# Altium footprint library PcbLib1.PcbLib: 62 footprints (part 4 of 4)
Each footprint in its own frame and in the unit in brackets; x right, y up, seen from the top. Pads: shape width x height; smd on the part's side, far side on the other; paste and mask are expansions set on the pad; w line width, h text height; cw(c..) or ccw(c..) is an arc to the next point about the centre after c.
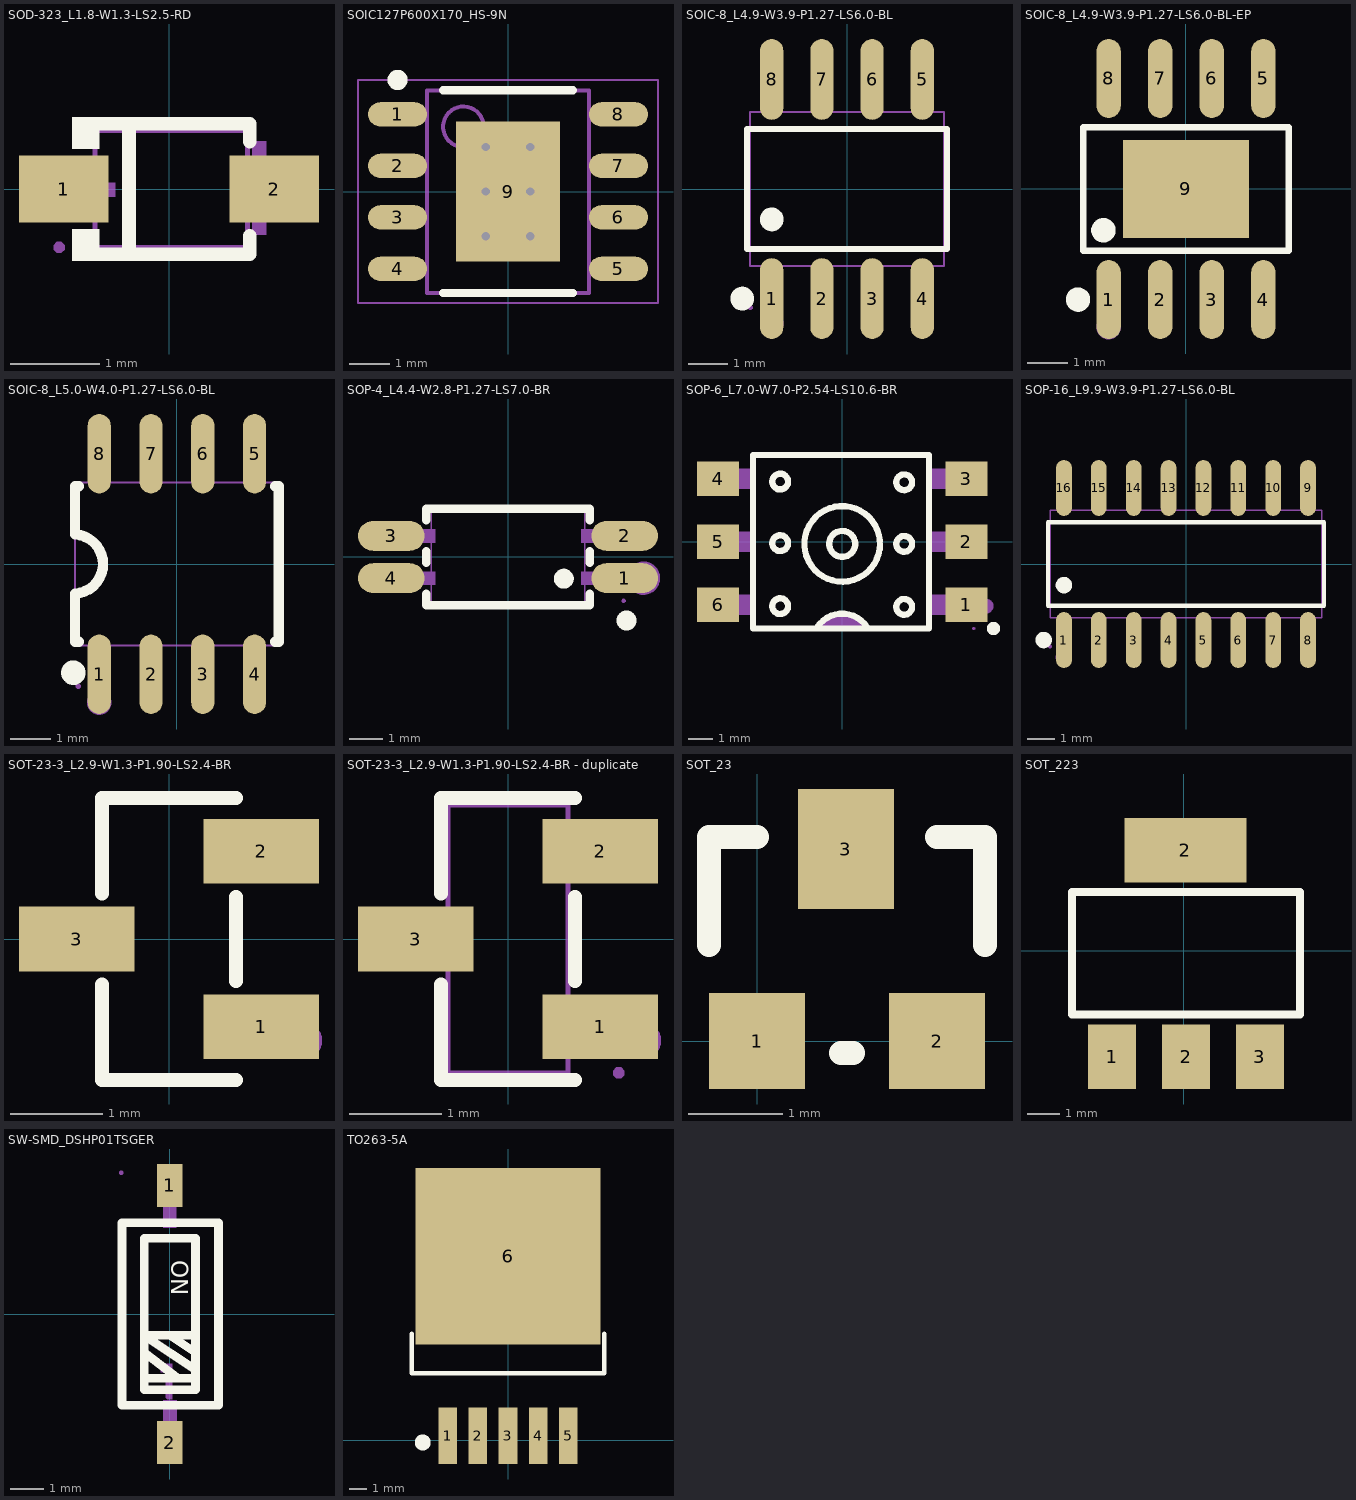
[diagram p3: the footprints below, top view; thin cyan lines are the x and y axes]

## SOD-323_L1.8-W1.3-LS2.5-RD [mm] "tvs"
pads (2):
  rect 1x0.75 smd: 1(-1.173,0) 2(1.173,0)
Top Overlay:
  region: -0.775,0.802 -0.775,0.45 -1.08,0.45 -1.08,0.802
  region: -0.775,-0.802 -0.775,-0.45 -1.08,-0.45 -1.08,-0.802
  lines w0.152: -0.851,-0.726 0.901,-0.726 0.901,-0.52 ; -0.851,0.726 0.901,0.726 0.901,0.53 ; -0.447,-0.726 -0.447,0.726
Mechanical 6:
  region: -1.225,0.07 -1.225,-0.086 -0.601,-0.086 -0.601,0.07
  region: 1.315,0.09 1.315,-0.066 0.691,-0.066 0.691,0.09
  region: 1.083,0.53 1.083,-0.51 0.927,-0.51 0.927,0.53
Mechanical 15:
  region: -1.165,-0.65 -1.165,-0.625 -1.2,-0.59 -1.25,-0.59 -1.285,-0.625 -1.285,-0.65 -1.285,-0.675 -1.25,-0.71 -1.2,-0.71 -1.165,-0.675
  region: 1.275,0.16 1.275,-0.16 0.975,-0.16 0.975,0.16
  region: 0.985,0.16 0.985,-0.16 0.865,-0.16 0.865,0.16
  region: -0.925,0.16 -0.925,-0.16 -1.225,-0.16 -1.225,0.16
  region: -0.815,0.16 -0.815,-0.16 -0.935,-0.16 -0.935,0.16
  lines w0.051: -0.825,-0.65 0.875,-0.65 0.875,0.65 -0.825,0.65 -0.825,-0.65

## SOIC127P600X170_HS-9N [mm] "SOIC, 8-Leads, Body 4.90x3.90mm, Pitch 1.27mm, Thermal Pad 3.45x2.56mm, IPC Medium Density转压"
height 1.7
pads (9):
  oval 1.45x0.6 smd: 1(-2.725,1.905) 2(-2.725,0.635) 3(-2.725,-0.635) 4(-2.725,-1.905) 5(2.725,-1.905) 6(2.725,-0.635) 7(2.725,0.635) 8(2.725,1.905)
  rect 2.56x3.45 smd: 9(0,0)
via -0.55,1.1 diameter 0.5 hole 0.2
via 0.55,1.1 diameter 0.5 hole 0.2
via -0.55,0 diameter 0.5 hole 0.2
via 0.55,0 diameter 0.5 hole 0.2
via -0.55,-1.1 diameter 0.5 hole 0.2
via 0.55,-1.1 diameter 0.5 hole 0.2
Top Overlay:
  circle w0.25: c-2.725,2.755 r0.125
  lines w0.2: -1.6,-2.5 1.6,-2.5 ; -1.6,2.5 1.6,2.5
Mechanical 13:
  circle w0.1: c-1.1,1.6 r0.5
  lines w0.1: -2,-2.5 -2,2.5 2,2.5 2,-2.5 -2,-2.5
Mechanical 15:
  lines w0.05: -3.7,-2.75 -3.7,2.75 3.7,2.75 3.7,-2.75 -3.7,-2.75
  lines w0.1: -0.5,0 0.5,0 ; 0,-0.5 0,0.5
3D body "SOIC127P600X170_HS-9N.step": height 1.7, standoff 0, extent -3,-2.5 3,2.5

## SOIC-8_L4.9-W3.9-P1.27-LS6.0-BL [mm] "can芯片vp230"
pads (8):
  oval 0.588x2.045 smd: 1(-1.905,-2.772) 2(-0.635,-2.772) 3(0.635,-2.772) 4(1.905,-2.772) 5(1.905,2.772) 6(0.635,2.772) 7(-0.635,2.772) 8(-1.905,2.772)
Top Overlay:
  circle w0.3: c-2.652,-2.772 r0.15
  circle w0.3: c-1.905,-0.769 r0.15
  lines w0.152: -2.526,-1.521 2.526,-1.521 2.526,1.521 -2.526,1.521 -2.526,-1.521
Mechanical 6:
  circle w0.3: c-1.905,-3.4 r0.15
Mechanical 15:
  region: 1.695,2.175 1.695,1.94 2.115,1.94 2.115,2.175
  region: 1.695,3 1.695,2.165 2.115,2.165 2.115,3
  region: 0.425,2.175 0.425,1.94 0.845,1.94 0.845,2.175
  region: 0.425,3 0.425,2.165 0.845,2.165 0.845,3
  region: -0.845,2.175 -0.845,1.94 -0.425,1.94 -0.425,2.175
  region: -0.845,3 -0.845,2.165 -0.425,2.165 -0.425,3
  region: -2.115,2.175 -2.115,1.94 -1.695,1.94 -1.695,2.175
  region: -2.115,3 -2.115,2.165 -1.695,2.165 -1.695,3
  region: 1.695,-2.175 1.695,-1.94 2.115,-1.94 2.115,-2.175
  region: 1.695,-3 1.695,-2.165 2.115,-2.165 2.115,-3
  region: 0.425,-2.175 0.425,-1.94 0.845,-1.94 0.845,-2.175
  region: 0.425,-3 0.425,-2.165 0.845,-2.165 0.845,-3
  region: -0.845,-2.175 -0.845,-1.94 -0.425,-1.94 -0.425,-2.175
  region: -0.845,-3 -0.845,-2.165 -0.425,-2.165 -0.425,-3
  region: -2.115,-2.175 -2.115,-1.94 -1.695,-1.94 -1.695,-2.175
  region: -2.115,-3 -2.115,-2.165 -1.695,-2.165 -1.695,-3
  region: -2.39,-3 -2.39,-2.975 -2.425,-2.94 -2.475,-2.94 -2.51,-2.975 -2.51,-3 -2.51,-3.025 -2.475,-3.06 -2.425,-3.06 -2.39,-3.025
  lines w0.051: -2.45,-1.95 2.45,-1.95 2.45,1.95 -2.45,1.95 -2.45,-1.95
3D body "SOIC-8.STEP": height 1.8, standoff 0.05, extent -2.45,-3.053 2.45,3.053

## SOIC-8_L4.9-W3.9-P1.27-LS6.0-BL-EP [mm]
pads (9):
  oval 0.602x1.941 smd: 1(-1.905,-2.72) 2(-0.635,-2.72) 3(0.635,-2.72) 4(1.905,-2.72) 5(1.905,2.72) 6(0.635,2.72) 7(-0.635,2.72) 8(-1.905,2.72)
  rect 3.098x2.41 smd: 9(0,0)
Top Overlay:
  circle w0.3: c-2.658,-2.721 r0.15
  circle w0.3: c-2.032,-1.016 r0.15
  lines w0.152: -2.526,-1.521 2.526,-1.521 2.526,1.521 -2.526,1.521 -2.526,-1.521
Mechanical 15:
  circle w0.3: c-1.905,-3.4 r0.15

## SOIC-8_L5.0-W4.0-P1.27-LS6.0-BL [mil] "can芯片"
pads (8):
  oval 22.38x76.78 smd: 1(-75,-106.5) 2(-25,-106.5) 3(25,-106.5) 4(75,-106.5) 5(75,106.5) 6(25,106.5) 7(-25,106.5) 8(-75,106.5)
Top Overlay:
  circle w11.81: c-100,-105 r5.91
  lines w10: -98.43,-28.61 ccw(c-99.99,0) -98.23,28.59 ; -98.42,-28.61 -98.42,-59.05 -98.42,-75 -94.83,-75 ; -98.42,28.59 -98.42,59.05 -98.42,75 -94.83,75 ; 94.83,-75 98.42,-75 98.42,-59.05 98.42,59.05 98.42,75 94.83,75
Mechanical 6:
  circle w11.81: c-75,-133.86 r5.91
Mechanical 15:
  region: -92.92,-118.11 -92.92,-117.13 -94.3,-115.75 -96.26,-115.75 -97.64,-117.13 -97.64,-118.11 -97.64,-119.09 -96.26,-120.47 -94.3,-120.47 -92.92,-119.09
  region: 66.93,76.38 66.93,85.63 83.07,85.63 83.07,76.38
  region: 66.93,85.24 66.93,118.11 83.07,118.11 83.07,85.24
  region: 16.93,76.38 16.93,85.63 33.07,85.63 33.07,76.38
  region: 16.93,85.24 16.93,118.11 33.07,118.11 33.07,85.24
  region: -33.07,76.38 -33.07,85.63 -16.93,85.63 -16.93,76.38
  region: -33.07,85.24 -33.07,118.11 -16.93,118.11 -16.93,85.24
  region: -83.07,76.38 -83.07,85.63 -66.93,85.63 -66.93,76.38
  region: -83.07,85.24 -83.07,118.11 -66.93,118.11 -66.93,85.24
  region: 66.93,-85.63 66.93,-76.38 83.07,-76.38 83.07,-85.63
  region: 66.93,-118.11 66.93,-85.24 83.07,-85.24 83.07,-118.11
  region: 16.93,-85.63 16.93,-76.38 33.07,-76.38 33.07,-85.63
  region: 16.93,-118.11 16.93,-85.24 33.07,-85.24 33.07,-118.11
  region: -33.07,-85.63 -33.07,-76.38 -16.93,-76.38 -16.93,-85.63
  region: -33.07,-118.11 -33.07,-85.24 -16.93,-85.24 -16.93,-118.11
  region: -83.07,-85.63 -83.07,-76.38 -66.93,-76.38 -66.93,-85.63
  region: -83.07,-118.11 -83.07,-85.24 -66.93,-85.24 -66.93,-118.11
  lines w2: -98.42,-78.74 -98.42,78.74 98.42,78.74 98.42,-78.74 -98.42,-78.74

## SOP-4_L4.4-W2.8-P1.27-LS7.0-BR [mm]
pads (4):
  oval 2x0.9 smd mask+0.051: 1(3.5,-0.635) 2(3.5,0.635) 3(-3.5,0.635) 4(-3.5,-0.635)
Top Overlay:
  lines w0.254: -2.45,-1.097 -2.45,-1.45 2.45,-1.45 2.45,-1.096 ; -2.45,-0.174 -2.45,0.173 ; -2.45,1.096 -2.45,1.45 2.45,1.45 2.45,1.096 ; 2.45,-0.174 2.45,0.174
  lines w0.3: 1.672,-0.801 cw(c1.673,-0.651) 1.674,-0.801 ; 3.555,-2.055 cw(c3.556,-1.905) 3.557,-2.055
Mechanical 6:
  circle w0.5: c4.064,-0.635 r0.25
Mechanical 15:
  region: 3.53,-1.32 3.53,-1.295 3.495,-1.26 3.445,-1.26 3.41,-1.295 3.41,-1.32 3.41,-1.345 3.445,-1.38 3.495,-1.38 3.53,-1.345 3.53,-1.32
  region: -2.81,-0.835 -2.81,-0.435 -2.19,-0.435 -2.19,-0.835
  region: -3.5,-0.835 -3.5,-0.435 -2.8,-0.435 -2.8,-0.835
  region: -2.81,0.435 -2.81,0.835 -2.19,0.835 -2.19,0.435
  region: -3.5,0.435 -3.5,0.835 -2.8,0.835 -2.8,0.435
  region: 2.19,0.435 2.19,0.835 2.81,0.835 2.81,0.435
  region: 2.8,0.435 2.8,0.835 3.5,0.835 3.5,0.435
  region: 2.19,-0.835 2.19,-0.435 2.81,-0.435 2.81,-0.835
  region: 2.8,-0.835 2.8,-0.435 3.5,-0.435 3.5,-0.835
  lines w0.051: -2.3,-1.35 -2.3,1.35 2.3,1.35 2.3,-1.35 -2.3,-1.35

## SOP-6_L7.0-W7.0-P2.54-LS10.6-BR [mm]
pads (6):
  rect 1.7x1.4 smd mask+0.05: 1(5.005,-2.54) 2(5.005,0) 3(5.005,2.54) 4(-5.005,2.54) 5(-5.005,0) 6(-5.005,-2.54)
Top Overlay:
  circle w0.254: c6.1,-3.5 r0.141
  circle w0.254: c-2.5,-2.6 r0.318
  circle w0.254: c-2.5,-0.06 r0.318
  circle w0.254: c-2.5,2.424 r0.318
  circle w0.254: c2.5,2.396 r0.318
  circle w0.254: c2.5,-0.088 r0.318
  circle w0.254: c2.5,-2.628 r0.318
  lines w0.254: -1.016,-3.465 cw(c0,-4.1) 1.016,-3.465 ; 0.468,0.146 ccw(c0,-0.088) 0.508,0.039 ; 1.519,0.039 ccw(c0,-0.088) 1.524,-0.088 ; 2.256,-3.5 3.5,-3.5 3.5,3.5 -3.6,3.5 -3.6,-3.5 -3.4,-3.5 2.451,-3.5
Mechanical 6:
  circle w0.3: c5.8,-2.6 r0.15
  region: -1.016,-3.465 -0.935,-3.336 -0.714,-3.126 -0.447,-2.978 -0.152,-2.902 0.152,-2.902 0.448,-2.978 0.714,-3.126 0.935,-3.336 1.016,-3.465
Mechanical 15:
  region: 5.36,-3.5 5.36,-3.475 5.325,-3.44 5.275,-3.44 5.24,-3.475 5.24,-3.5 5.24,-3.525 5.275,-3.56 5.325,-3.56 5.36,-3.525 5.36,-3.5
  region: -4.51,-2.94 -4.51,-2.14 -3.49,-2.14 -3.49,-2.94
  region: -5.3,-2.94 -5.3,-2.14 -4.5,-2.14 -4.5,-2.94
  region: -4.51,-0.4 -4.51,0.4 -3.49,0.4 -3.49,-0.4
  region: -5.3,-0.4 -5.3,0.4 -4.5,0.4 -4.5,-0.4
  region: -4.51,2.14 -4.51,2.94 -3.49,2.94 -3.49,2.14
  region: -5.3,2.14 -5.3,2.94 -4.5,2.94 -4.5,2.14
  region: 3.49,2.14 3.49,2.94 4.51,2.94 4.51,2.14
  region: 4.5,2.14 4.5,2.94 5.3,2.94 5.3,2.14
  region: 3.49,-0.4 3.49,0.4 4.51,0.4 4.51,-0.4
  region: 4.5,-0.4 4.5,0.4 5.3,0.4 5.3,-0.4
  region: 3.49,-2.94 3.49,-2.14 4.51,-2.14 4.51,-2.94
  region: 4.5,-2.94 4.5,-2.14 5.3,-2.14 5.3,-2.94
  lines w0.051: -3.5,-3.5 -3.5,3.5 3.5,3.5 3.5,-3.5 -3.5,-3.5

## SOP-16_L9.9-W3.9-P1.27-LS6.0-BL [mm] "MAX3232"
pads (16):
  oval 0.574x2.038 smd: 1(-4.445,-2.769) 2(-3.175,-2.769) 3(-1.905,-2.769) 4(-0.635,-2.769) 5(0.635,-2.769) 6(1.905,-2.769) 7(3.175,-2.769) 8(4.445,-2.769) 9(4.445,2.769) 10(3.175,2.769) 11(1.905,2.769) 12(0.635,2.769) 13(-0.635,2.769) 14(-1.905,2.769) 15(-3.175,2.769) 16(-4.445,2.769)
Top Overlay:
  circle w0.3: c-5.184,-2.769 r0.15
  circle w0.3: c-4.445,-0.769 r0.15
  lines w0.152: -5.026,-1.521 5.026,-1.521 5.026,1.521 -5.026,1.521 -5.026,-1.521
Mechanical 6:
  circle w0.3: c-4.445,-3.4 r0.15
Mechanical 15:
  drawing of 37 lines, arcs and shapes, not listed
3D body "SOP-16.STEP": height 1.59, standoff 0.03, extent -4.95,-3 4.95,3

## SOT-23-3_L2.9-W1.3-P1.90-LS2.4-BR [mm] "静电放电(ESD)保护器件"
pads (3):
  rect 1.25x0.7 smd: 1(1,-0.95) 2(1,0.95) 3(-1,0)
Top Overlay:
  lines w0.152: -0.726,-0.495 -0.726,-1.526 0.726,-1.526 ; -0.726,0.495 -0.726,1.526 0.726,1.526 ; 0.726,-0.455 0.726,0.455
Mechanical 15:
  circle w0.2: c1.46,-1.1 r0.1
3D body "SOT-23-3.STEP": height 1.2, standoff 0, extent -1.4,-1.45 1.4,1.45

## SOT-23-3_L2.9-W1.3-P1.90-LS2.4-BR - duplicate [mm]
pads (3):
  rect 1.25x0.7 smd: 1(1,-0.95) 2(1,0.95) 3(-1,0)
Top Overlay:
  lines w0.152: -0.726,-0.495 -0.726,-1.526 0.726,-1.526 ; -0.726,0.495 -0.726,1.526 0.726,1.526 ; 0.726,-0.455 0.726,0.455
Mechanical 6:
  circle w0.2: c1.46,-1.1 r0.1
Mechanical 15:
  region: -1.2,-0.215 -1.2,0.215 -0.9,0.215 -0.9,-0.215
  region: -0.91,-0.215 -0.91,0.215 -0.64,0.215 -0.64,-0.215
  region: 0.9,-1.165 0.9,-0.735 1.2,-0.735 1.2,-1.165
  region: 0.64,-1.165 0.64,-0.735 0.91,-0.735 0.91,-1.165
  region: 0.9,0.735 0.9,1.165 1.2,1.165 1.2,0.735
  region: 0.64,0.735 0.64,1.165 0.91,1.165 0.91,0.735
  region: 1.26,-1.45 1.26,-1.425 1.225,-1.39 1.175,-1.39 1.14,-1.425 1.14,-1.45 1.14,-1.475 1.175,-1.51 1.225,-1.51 1.26,-1.475
  lines w0.051: -0.65,-1.45 0.65,-1.45 0.65,1.45 -0.65,1.45 -0.65,-1.45

## SOT_23 [mil]
pads (3):
  rect 40x40 smd: 1(0,0) 2(75,0)
  rect 40x50 smd: 3(37,80)
Top Overlay:
  lines w10: -20,40 -20,85 0,85 ; 35,-5 40,-5 ; 75,85 95,85 95,40
3D body "SOT-23-3.STEP": height 47.24, standoff 0, extent -19.76,-11.65 94.42,98.59

## SOT_223 [mil]
pads (4):
  rect 59x79 smd: 1(-88,-130) 2(2.55,-130) 3(93.1,-130)
  rect 150x79 smd: 2(1.88,123.54)
Top Overlay:
  lines w10: -137.45,-78 142.55,-78 142.55,72 -137.45,72 -137.45,-78
3D body "AMS1117.step": height 73.46, standoff 0.24, extent -123,-143.78 132.91,131.78

## SW-SMD_DSHP01TSGER [mm] "1.27mm开关"
pads (2):
  rect 0.76x1.27 smd paste+0 mask+0.05: 1(0,3.81) 2(0,-3.81)
Top Overlay:
  lines w0.254: -1.417,2.7 -1.417,-2.709 1.452,-2.709 1.452,-2.662 1.443,-2.662 1.443,2.709 -1.407,2.709 ; -0.761,-1.905 0.763,-1.905 ; -0.761,-1.143 0.255,-1.905 ; 0.001,-0.635 0.763,-1.143 ; 0.763,-1.651 -0.761,-0.635 0.763,-0.635 ; -0.762,-2.25 -0.762,2.25 0.762,2.25 0.762,-2.25 -0.762,-2.25
  text "ON" at 0.047,1.59 h0.49
Mechanical 6:
  region: 0.075,-1.475 0.075,-2.525 -0.075,-2.525 -0.125,-2.475 -0.125,-1.725 -0.275,-1.725 -0.275,-1.625 -0.125,-1.475
Mechanical 15:
  region: -0.2,-4.185 -0.2,-3.385 0.2,-3.385 0.2,-4.185
  region: -0.2,3.385 -0.2,4.185 0.2,4.185 0.2,3.385
  region: 0.199,-2.554 0.201,-4.187 -0.197,-4.187 -0.197,-2.559 0.199,-2.559
  region: -0.199,2.552 -0.201,4.185 0.197,4.185 0.197,2.557 -0.199,2.557
  region: -1.38,4.185 -1.38,4.21 -1.415,4.245 -1.465,4.245 -1.5,4.21 -1.5,4.185 -1.5,4.16 -1.465,4.125 -1.415,4.125 -1.38,4.16
  lines w0.051: -1.44,-2.7 1.44,-2.7 1.44,2.7 -1.44,2.7 -1.44,-2.7
3D body "SMD,2.9x5.4mm.STEP": height 2.3, standoff -0.01, extent -1.377,-4.137 1.51,4.213

## TO263-5A [mm] "263，5脚晶体管"
pads (6):
  rect 1.05x3.2 smd: 1(-3.4,0.254) 2(-1.7,0.254) 3(0,0.254) 4(1.7,0.254) 5(3.4,0.254)
  rect 10.45x10 smd: 6(0,10.414)
Top Overlay:
  circle w0.5: c-4.826,-0.127 r0.2
  lines w0.254: -5.461,6.037 -5.461,3.787 5.461,3.787 5.461,6.037
3D body "TO263-5A.STEP": height 4.5, standoff 0, extent -5,0.244 5,13.571